# Altium footprint library 我的元件库01.PcbLib: 321 footprints (part 20 of 21)
Each footprint in its own frame and in the unit in brackets; x right, y up, seen from the top. Pads: shape width x height; smd on the part's side, far side on the other; paste and mask are expansions set on the pad; w line width, h text height; cw(c..) or ccw(c..) is an arc to the next point about the centre after c.
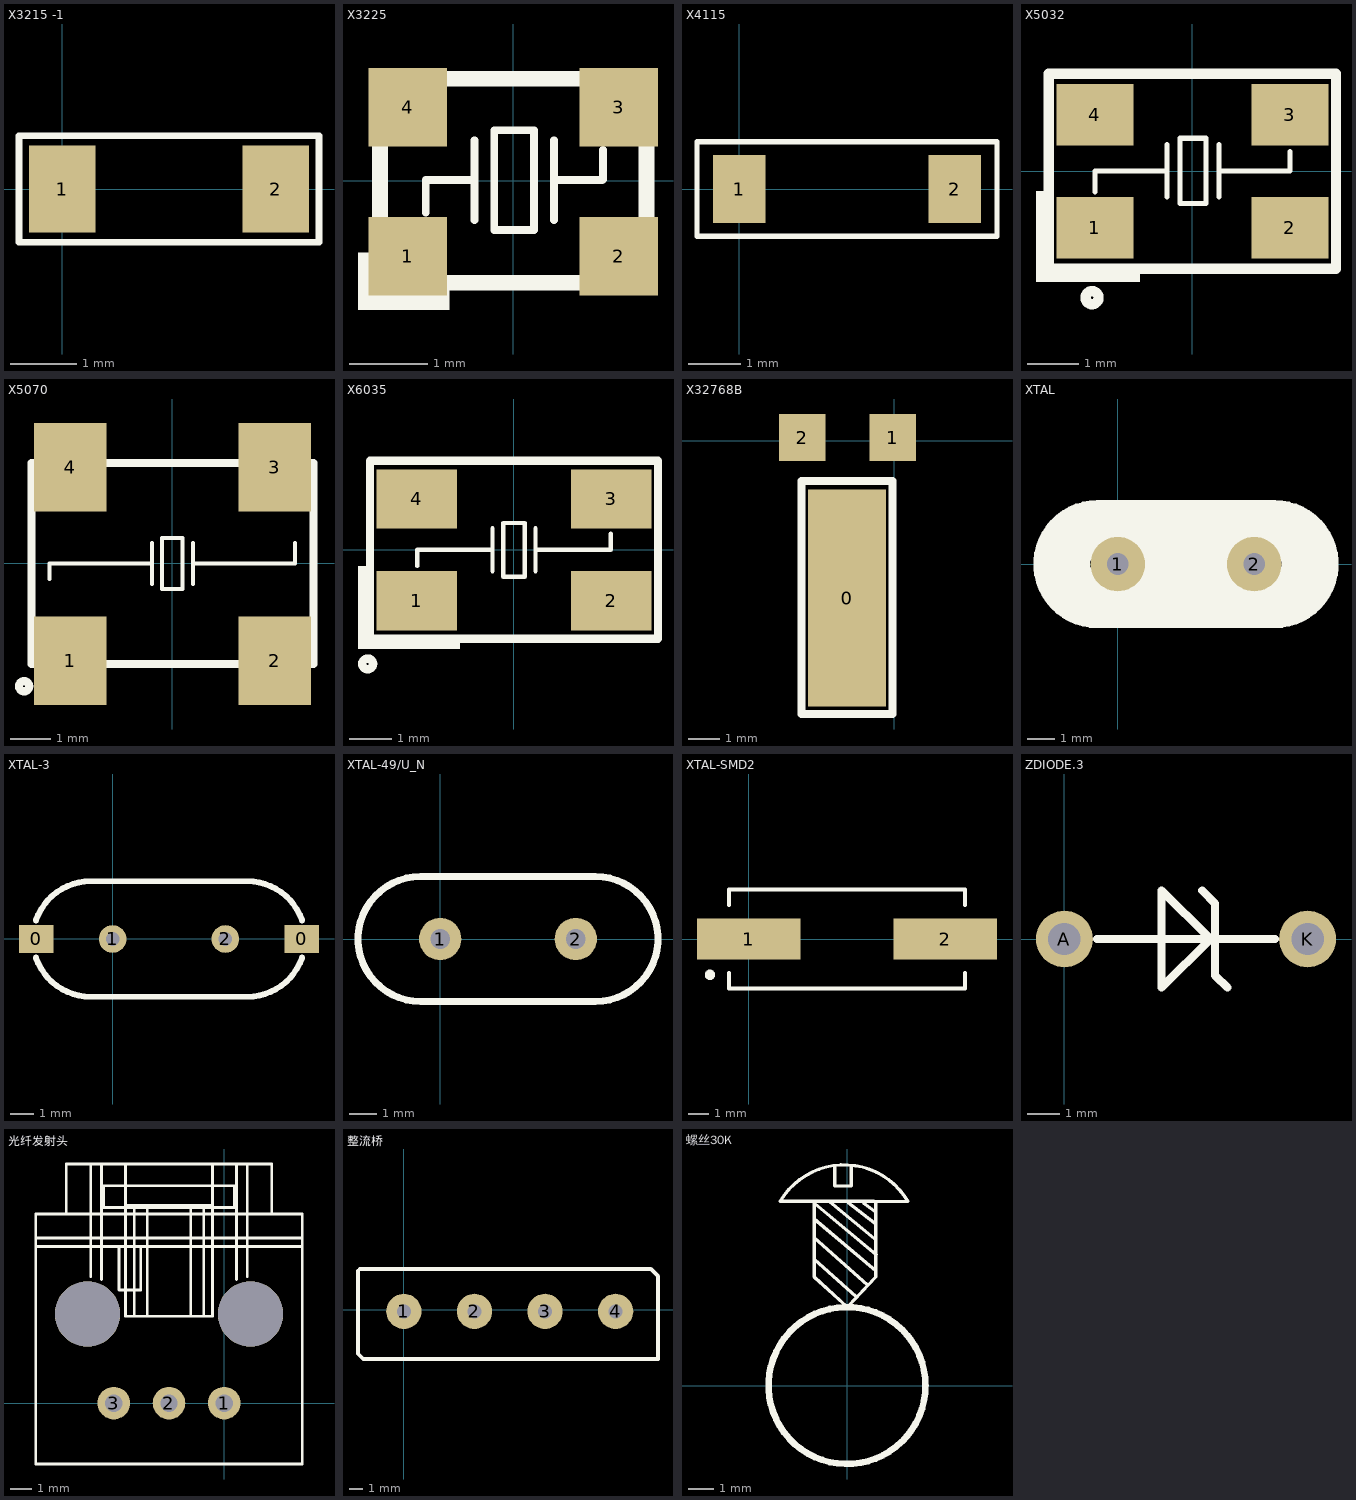
[diagram p19: the footprints below, top view; thin cyan lines are the x and y axes]

## X3215 -1 [mm]
pads (2):
  rect 1x1.3 smd: 1(0,0) 2(3.2,0)
Top Overlay:
  lines w0.1: -0.65,-0.8 3.85,-0.8 3.85,0.8 -0.65,0.8 -0.65,-0.8
3D body "User Library-Siward_SX3215.STEP": height 0.81, standoff 0, extent 0.026,-0.787 3.226,0.713

## X3225 [mm]
pads (4):
  rect 1x1 smd: 1(-1.346,-0.965) 2(1.346,-0.965) 3(1.346,0.94) 4(-1.346,0.94)
Top Overlay:
  rectangle: -1.981,-1.651 -1.803,-0.914
  rectangle: -1.803,-1.651 -0.813,-1.397
  lines w0.1: -1.118,-0.406 -1.118,0.008 -0.496,0.008 ; -0.496,-0.5 -0.496,0.516 ; 0.52,-0.5 0.52,0.516 ; 0.52,0.008 1.135,0.008 1.143,0.016 ; 1.143,0.025 1.143,0.39 ; -0.242,-0.627 0.266,-0.627 0.266,-0.309 0.266,0.326 0.266,0.643 -0.242,0.643 -0.242,-0.627
  lines w0.2: -1.7,-1.3 -1.7,1.3 1.7,1.3 1.7,-1.3 -1.7,-1.3
3D body "User Library-X32-3_2x2_5.STEP": height 0.72, standoff 0, extent -1.549,-1.281 1.651,1.219

## X4115 [mm]
pads (2):
  rect 1x1.3 smd: 1(0,0) 2(4.1,0)
Top Overlay:
  lines w0.1: -0.8,-0.9 4.9,-0.9 4.9,0.9 -0.8,0.9 -0.8,-0.851

## X5032 [mm]
pads (4):
  rect 1.5x1.2 smd: 1(-1.9,-1.1) 2(1.9,-1.1) 3(1.9,1.1) 4(-1.9,1.1)
Top Overlay:
  circle w0.2: c-1.956,-2.464 r0.127
  rectangle: -3.048,-2.159 -2.87,-0.381
  rectangle: -3.023,-2.159 -1.016,-1.905
  lines w0.1: -1.897,-0.406 -1.897,0.008 -0.496,0.008 ; -0.496,-0.5 -0.496,0.516 ; 0.52,-0.5 0.52,0.516 ; 0.52,0.008 1.902,0.008 1.905,0.016 1.905,0.381 ; -0.242,-0.627 0.266,-0.627 0.266,-0.309 0.266,0.326 0.266,0.643 -0.242,0.643 -0.242,-0.627
  lines w0.2: -2.8,-1.9 -2.8,1.9 2.8,1.9 2.8,-1.9 -2.8,-1.9
3D body "User Library-CRYSTALSMD5X32.STEP": height 1, standoff 0, extent -2.5,-1.6 2.5,1.6

## X5070 [mm]
pads (4):
  rect 1.8x2.2 smd: 1(-2.54,-2.413) 2(2.54,-2.413) 3(2.54,2.388) 4(-2.54,2.388)
Top Overlay:
  circle w0.2: c-3.683,-3.048 r0.127
  lines w0.1: -3.048,-0.381 -3.048,0 -0.508,0 ; -0.508,-0.508 -0.508,0.508 ; 0.508,-0.508 0.508,0.508 ; 0.508,0 3.048,0 3.048,0.508 ; -0.254,-0.635 -0.254,0.635 0.254,0.635 0.254,-0.635 -0.254,-0.635
  lines w0.2: -3.5,-2.5 3.5,-2.5 3.5,2.5 -3.5,2.5 -3.5,-2.5
3D body "User Library-GeyerElectronics_KX13.STEP": height 1.31, standoff 0, extent -3.576,-2.54 3.424,2.46

## X6035 [mm]
pads (4):
  rect 1.9x1.4 smd: 1(-2.3,-1.2) 2(2.3,-1.2) 3(2.3,1.2) 4(-2.3,1.2)
Top Overlay:
  circle w0.2: c-3.454,-2.692 r0.127
  rectangle: -3.658,-2.337 -1.27,-2.108
  rectangle: -3.683,-2.337 -3.48,-0.381
  lines w0.1: -2.286,-0.381 -2.286,0 -2.032,0 -0.508,0 ; -0.508,-0.508 -0.508,0.508 ; 0.508,-0.508 0.508,0.508 ; 0.508,0 2.286,0 2.286,0.381 ; -0.254,-0.635 -0.254,0.635 0.254,0.635 0.254,-0.635 -0.254,-0.635
  lines w0.2: -3.4,-2.1 3.4,-2.1 3.4,2.1 -3.4,2.1 -3.4,-2.1

## X32768B [mil]
pads (3):
  rect 98.43x275.59 smd: 0(-60,-199.91)
  rect 59.06x60 smd: 1(-2,4) 2(-117,4)
Top Overlay:
  lines w10: -118,-347 -118,-51 -2,-51 -2,-347 -118,-347
3D body "User Library-CMR200TB.STEP": height 78.73, standoff 0, extent -119.14,-320 1.14,33.43

## XTAL [mm]
pads (2):
  round 2 hole 0.8: 1(0,0) 2(5,0)
Top Overlay:
  circle w1.2: c-0.753,0 r1.653
  circle w1.2: c5.747,0 r1.653
  rectangle: -0.75,-2.243 5.75,2.257
  lines w0.2: -0.75,-2.25 cw(c-0.75,0) -0.75,2.25 5.75,2.25 cw(c5.75,0) 5.75,-2.25 -0.75,-2.25
  lines w0.254: 5.337,1.229 cw(c5,0) 5.35,1.225
  lines w1: -0.743,0.8 ccw(c-0.725,0) -0.725,-0.8 ; 5.707,0.8 cw(c5.707,0) 5.725,-0.8
3D body "hc-49s_y.stp": height 3.5, standoff -3, extent -2.95,-2.255 7.85,2.245

## XTAL-3 [mm]
pads (4):
  rect 1.5x1.2 smd: 0(-3.31,0) 0(8.19,0)
  round 1.2 hole 0.6: 1(0,0) 2(4.88,0)
Top Overlay:
  lines w0.254: -3.325,-0.809 ccw(c-0.96,0) -0.96,-2.5 ; -3.325,0.809 cw(c-0.96,0) -0.96,2.5 5.84,2.5 cw(c5.84,0) 8.205,0.809 ; -0.965,-2.5 5.84,-2.5 ccw(c5.84,0) 8.205,-0.809
3D body "hc-49s_y.stp": height 3.5, standoff -3, extent -2.95,-2.255 7.85,2.245

## XTAL-49/U_N [mil] "高型晶振（未加焊）"
pads (2):
  round 60 hole 28: 1(0,0) 2(192,0)
Top Overlay:
  lines w10: -28,-88.5 cw(c-28,0) -28,88.5 220,88.5 cw(c220,0) 220,-88.5 -28,-88.5
3D body "hc-49u_n.stp": height 511.81, standoff -118.11, extent -116.54,-88.39 308.66,88.78

## XTAL-SMD2 [mm]
pads (2):
  rect 5x2 smd: 1(0,0) 2(9.5,0)
Top Overlay:
  circle w0.25: c-1.875,-1.73 r0.125
  lines w0.2: -0.95,-1.65 -0.95,-2.4 10.45,-2.4 10.45,-1.65 ; -0.95,1.65 -0.95,2.4 10.45,2.4 10.45,1.65
3D body "User Library-hc49_cystal.STEP": height 4, standoff 0, extent -1.95,-2.462 11.45,2.438

## ZDIODE.3 [mil]
pads (2):
  round 70 hole 40: A(0,0) K(300,0)
Top Overlay:
  lines w10: 40,0 260,0 ; 170,60 186,44 186,-45 ; 179,1 120,60 120,-60 180,0 ; 186.5,-45.5 201,-60

## 光纤发射头 [mm]
pads (5):
  round 1.5 hole 0.8 mask+0.102: 1(0,0) 2(-2.54,0) 3(-5.08,0)
  round 3 hole 3 unplated: ""(-6.29,4.1) ""(1.21,4.1)
Top Overlay:
  lines w0.127: -8.665,7.2 3.585,7.2 ; -8.665,7.6 3.585,7.6 ; -7.265,8.7 -7.265,11 2.185,11 2.185,8.7 ; -6.14,5.815 -6.14,11 ; -5.64,5.688 -5.64,11 ; -4.84,7.2 -4.84,5.2 -3.84,5.2 -3.84,7.2 ; -4.54,9.1 -0.54,9.1 ; -4.54,11 -4.54,4 -0.54,4 -0.54,11 ; -4.14,4.1 -4.14,9.1 ; -3.54,4.1 -3.54,9.1 ; -1.54,4.1 -1.54,9.1 ; -0.94,4.1 -0.94,9.1 ; 0.56,5.688 0.56,11 ; 1.06,5.815 1.06,11 ; -8.665,-2.801 -8.665,8.7 3.585,8.7 3.585,5.75 3.585,-2.801 -8.665,-2.801 ; -5.54,9 0.46,9 0.46,10 -5.54,10 -5.54,9
Bottom Overlay:
  lines w0.8: -3.81,-0.871 -3.81,0.78 ; -1.27,-0.871 -1.27,0.78

## 散热片 [mm]
3D body "SW3dPS-heatsink TO126.STEP": height 25, standoff -3.8, extent -7.544,-2.286 7.237,8.515

## 整流桥 [mm]
pads (4):
  round 2.54 hole 1: 1(0,-0.127) 2(5.08,-0.127) 3(10.16,-0.127) 4(15.24,-0.127)
Top Overlay:
  lines w0.254: -3.302,2.794 -3.302,-3.175 -2.921,-3.556 18.288,-3.556 18.288,2.413 17.78,2.921 -3.175,2.921

## 螺丝30K [mm]
Top Overlay:
  circle w0.254: c0,0 r3.05
  lines w0.127: -1.278,4.91 0.356,3.454 ; -1.278,5.744 0.782,3.916 ; -1.278,6.472 1.119,4.466 ; -1.242,7.058 1.137,5.087 ; -0.674,7.147 1.066,5.709 ; -0.479,8.531 -0.479,7.75 0.16,7.75 0.16,8.531 ; 0.036,7.111 1.066,6.312 ; 0.64,7.093 1.066,6.774 ; 1.048,7.164 -1.278,7.164 ; -1.278,7.164 -1.278,4.218 0.018,3.046 1.119,4.218 1.119,7.147 2.373,7.15 ccw(c-0.113,5.698) -2.591,7.164 -1.278,7.164
Bottom Overlay:
  circle w0.2: c0,0 r3.05
  lines w0.2: -2.587,7.212 cw(c-0.169,5.818) 2.276,7.163
  lines w0.254: -2.534,7.182 -2.547,7.194 2.333,7.194 ; -1.208,7.057 -1.208,4.279 0.006,3.065 1.17,4.229 1.17,7.032 ; -0.482,8.533 -0.47,8.546 -0.47,7.795 0.181,7.795 0.181,8.446